# Altium footprint library PCB_Module.PcbLib: 32 footprints (part 1 of 2)
Each footprint in its own frame and in the unit in brackets; x right, y up, seen from the top. Pads: shape width x height; smd on the part's side, far side on the other; paste and mask are expansions set on the pad; w line width, h text height; cw(c..) or ccw(c..) is an arc to the next point about the centre after c.
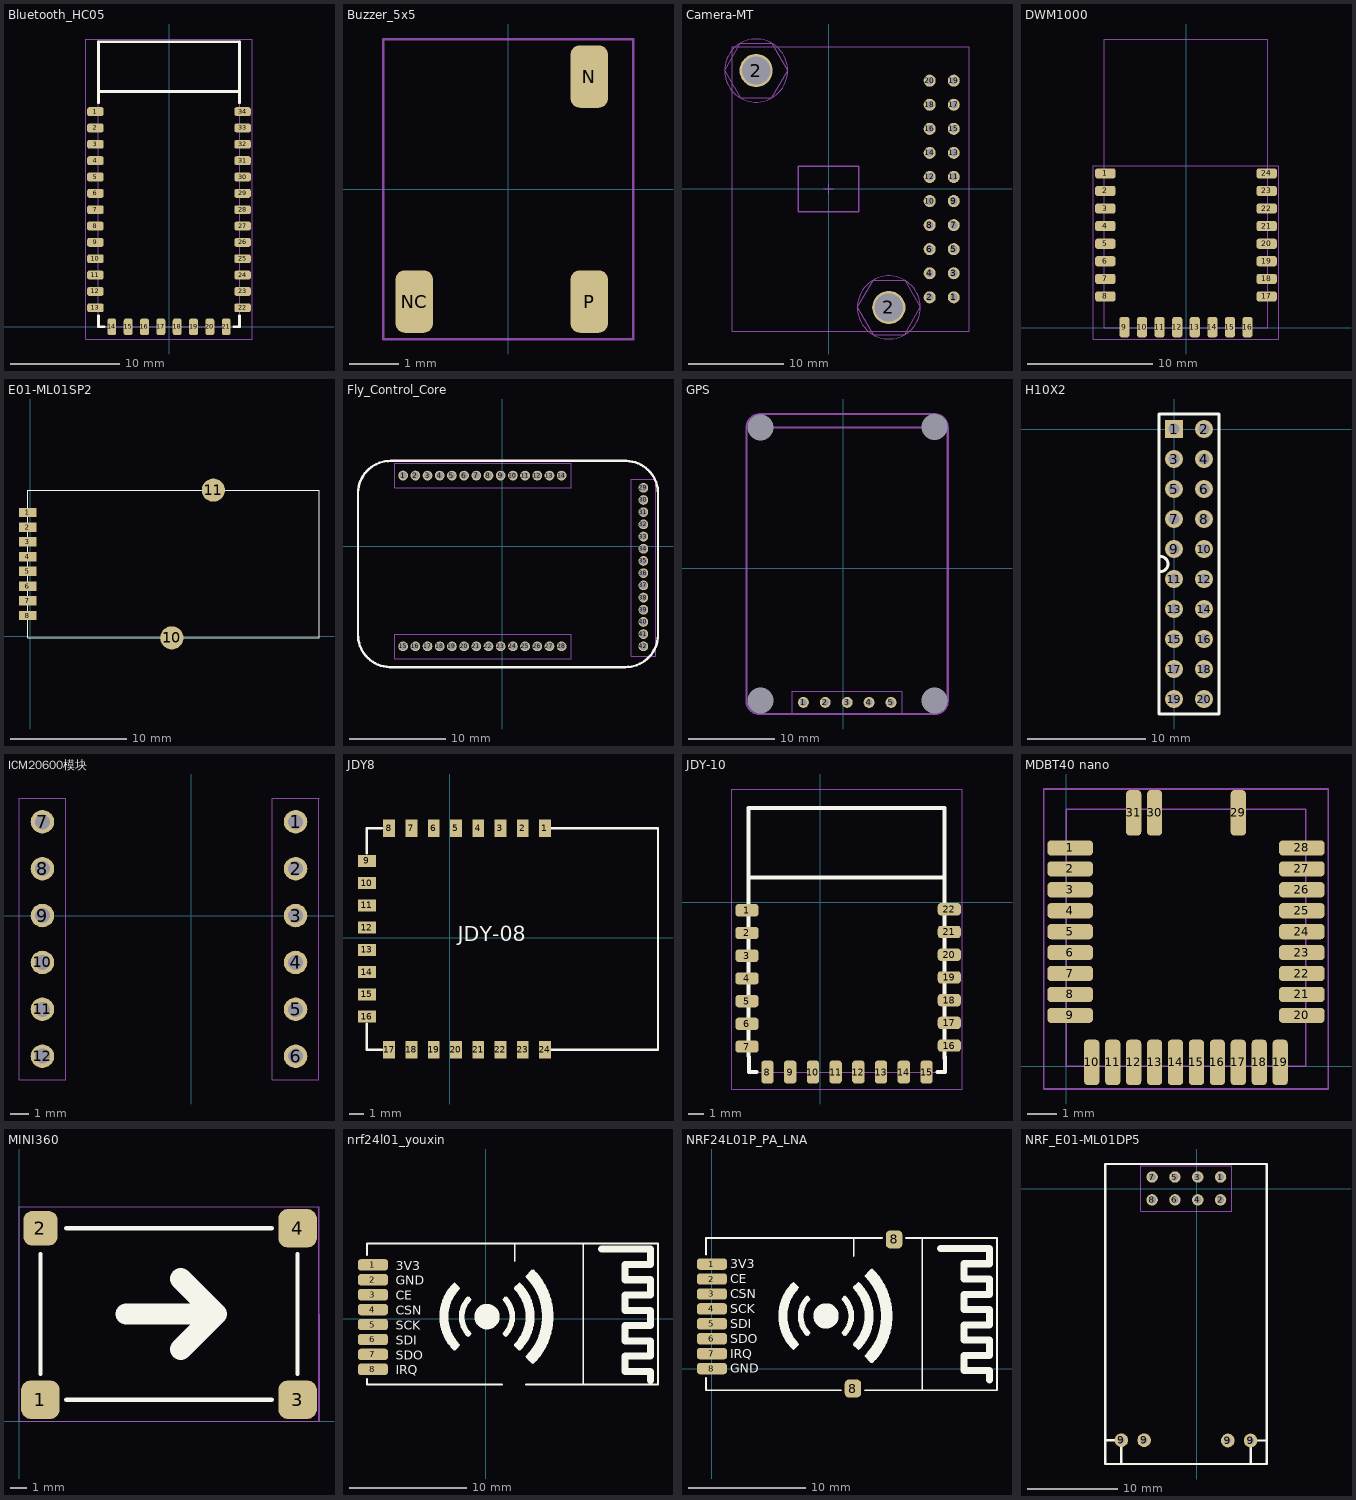
[diagram p0: the footprints below, top view; thin cyan lines are the x and y axes]

## Bluetooth_HC05 [mil]
pads (34):
  rrect50% 60x32 smd: 1(-265.91,777.56) 2(-265.91,718.5) 3(-265.91,659.45) 4(-265.91,600.39) 5(-265.91,541.34) 6(-265.91,482.28) 7(-265.91,423.23) 8(-265.91,364.17) 9(-265.91,305.12) 10(-265.91,246.06) 11(-265.91,187.01) 12(-265.91,127.95) 13(-265.91,68.9) 22(265.91,68.9) 23(265.91,127.95) 24(265.91,187.01) 25(265.91,246.06) 26(265.91,305.12) 27(265.91,364.17) 28(265.91,423.23) 29(265.91,482.28) 30(265.91,541.34) 31(265.91,600.39) 32(265.91,659.45) 33(265.91,718.5) 34(265.91,777.56)
  rrect50% 32x60 smd: 14(-206.69,0) 15(-147.64,0) 16(-88.58,0) 17(-29.53,0) 18(29.53,0) 19(88.58,0) 20(147.64,0) 21(206.69,0)
Top Overlay:
  lines w10: -255,40 -255,0 -235,0 ; -255,810 -255,850 ; 235,0 255,0 255,40 ; 255,810 255,850 ; -255,850 255,850 ; -255,850 -255,1030 255,1030 255,850
Mechanical 13:
  lines w2: -255.91,850.39 255.91,850.39 ; -255.91,0 -255.91,1039.37 255.91,1039.37 255.91,0 -255.91,0
T-Component:
  lines w2: -300,-44 -300,1040 300,1040 300,-44 -300,-44
3D body "User Library-Bluetooth HC-06_.STEP": height 92.52, standoff 0, extent -275.98,0 275.98,1102.76

## Buzzer_5x5 [mil]
pads (3):
  rrect50% 30x50 smd: N(65,90) NC(-75,-90) P(65,-90)
T-Component:
  lines w2: -100,-120 100,-120 100,120 -100,120 -100,-120
3D body "css-0575b-smt.stp": height 106.3, standoff 0, extent -98.44,-98.43 98.41,98.43

## Camera-MT [mil]
pads (22):
  round 50 hole 31: 1(520,-450) 2(420,-450) 3(520,-350) 4(420,-350) 5(520,-250) 6(420,-250) 7(520,-150) 8(420,-150) 9(520,-50) 10(420,-50) 11(520,50) 12(420,50) 13(520,150) 14(420,150) 15(520,250) 16(420,250) 17(520,350) 18(420,350) 19(520,450) 20(420,450)
  round 137.8 hole 118.11 mask+0: 2(-300.94,492.13) 2(250.24,-492.13)
Mechanical 13:
  circle w2: c250.24,-492.13 r130.98
  circle w2: c-300.94,492.13 r130.98
  lines w2: -19.69,0 19.68,0 ; 0,-19.69 0,19.68 ; -431.92,492.13 -366.43,378.7 -235.46,378.7 -169.97,492.12 -235.46,605.55 -366.43,605.55 -431.92,492.13 ; -399.37,-590.55 584.88,-590.55 584.88,590.55 -399.37,590.55 -399.37,-590.55 ; 119.26,-492.13 184.75,-605.56 315.72,-605.56 381.21,-492.13 315.72,-378.7 184.75,-378.7 119.26,-492.13
  lines w6: -126,-94 -126,94 126,94 126,-94 -126,-94
B-Component:
  lines w1: 510,-450 530,-450 ; 510,-350 530,-350 ; 510,-250 530,-250 ; 510,-150 530,-150 ; 510,-50 530,-50 ; 510,50 530,50 ; 510,150 530,150 ; 510,250 530,250 ; 510,350 530,350 ; 510,450 530,450 ; 520,-460 520,-440 ; 520,-360 520,-340 ; 520,-260 520,-240 ; 520,-160 520,-140 ; 520,-60 520,-40 ; 520,40 520,60 ; 520,140 520,160 ; 520,240 520,260 ; 520,340 520,360 ; 520,440 520,460
3D body "female_header_a-bl254-dg-g04d.stp": height 334.65, standoff -125.98, extent 371.57,-504.91 568.42,-295.07
3D body "female_header_a-bl254-dg-g06d.stp": height 334.65, standoff -125.98, extent 371.57,-304.92 568.42,4.93
3D body "female_header_a-bl254-dg-g06d.stp": height 334.65, standoff -125.98, extent 371.57,195.08 568.42,504.93
3D body "female_header_a-bl254-dg-g04d.stp": height 334.65, standoff -125.98, extent 371.57,-4.91 568.42,204.93
3D body "Camera-MT__Pcb.step": height 528.82, standoff 114.65, extent -399.36,-590.55 584.89,590.55

## DWM1000 [mil]
pads (24):
  rrect50% 64x32 smd: 1(-253,484.25) 2(-253,429.13) 3(-253,374.02) 4(-253,318.9) 5(-253,263.78) 6(-253,208.66) 7(-253,153.54) 8(-253,98.43) 17(253,98.43) 18(253,153.54) 19(253,208.66) 20(253,263.78) 21(253,318.9) 22(253,374.02) 23(253,429.13) 24(253,484.25)
  rrect50% 32x64 smd: 9(-192.91,2) 10(-137.8,2) 11(-82.68,2) 12(-27.56,2) 13(27.56,2) 14(82.68,2) 15(137.8,2) 16(192.91,2)
Mechanical 13:
  lines w1.97: -255.91,905.51 -255.91,0 255.91,0 255.91,905.51
  lines w2: -255.91,905.51 255.91,905.51
T-Component:
  lines w2: -290,-35 290,-35 290,508 -290,508 -290,-35
3D body "DWM1000 Module.STEP": height 114.17, standoff -0.39, extent -255.9,0 255.9,905.51

## E01-ML01SP2 [mm]
pads (10):
  rect 1.5x0.8 smd: 1(-0.225,10.689) 2(-0.225,9.419) 3(-0.225,8.149) 4(-0.225,6.879) 5(-0.225,5.609) 6(-0.225,4.339) 7(-0.225,3.069) 8(-0.225,1.799)
  round 2 smd: 10(12.195,-0.121) 11(15.775,12.609)
Top Overlay:
  lines w0.1: -0.225,-0.121 24.875,-0.121 24.875,12.609 -0.225,12.609 -0.225,-0.121

## Fly_Control_Core [mil]
height 50
pads (42):
  round 40 hole 30: 1(-406.44,288.88) 2(-356.44,288.88) 3(-306.44,288.88) 4(-256.44,288.88) 5(-206.44,288.88) 6(-156.44,288.88) 7(-106.44,288.88) 8(-56.44,288.88) 9(-6.44,288.88) 10(43.56,288.88) 11(93.56,288.88) 12(143.56,288.88) 13(193.56,288.88) 14(243.56,288.88) 15(-406.44,-411.11) 16(-356.44,-411.11) 17(-306.44,-411.11) 18(-256.44,-411.11) 19(-206.44,-411.12) 20(-156.44,-411.12) 21(-106.44,-411.12) 22(-56.44,-411.12) 23(-6.44,-411.12) 24(43.56,-411.12) 25(93.56,-411.12) 26(143.56,-411.12) 27(193.56,-411.12) 28(243.56,-411.12) 29(578.56,238.88) 30(578.56,188.88) 31(578.56,138.88) 32(578.56,88.88) 33(578.56,38.88) 34(578.56,-11.12) 35(578.55,-61.12) 36(578.55,-111.12) 37(578.55,-161.12) 38(578.55,-211.12) 39(578.55,-261.12) 40(578.55,-311.12) 41(578.55,-361.12) 42(578.55,-411.12)
Top Overlay:
  lines w10: 638.56,-366.12 cw(c506.06,-363.62) 503.56,-496.12 -461.44,-496.12 cw(c-458.94,-363.62) -591.44,-361.12 -591.44,218.88 cw(c-458.94,216.38) -456.44,348.88 478.56,348.88 508.56,348.88 cw(c506.06,216.38) 638.56,213.88 638.56,-361.12
Mechanical 13:
  lines w2: -441.44,-461.11 -441.44,-361.11 283.56,-361.11 283.56,-461.11 -441.44,-461.11 ; -441.44,238.88 -441.44,338.88 283.56,338.88 283.56,238.88 -441.44,238.88 ; 528.56,-451.12 528.56,273.88 628.56,273.88 628.56,-451.12 528.56,-451.12
T-Component:
  lines w2: -441.44,-461.11 283.56,-461.11 283.56,-361.11 -441.44,-361.11 -441.44,-461.11 ; -441.44,238.88 283.56,238.88 283.56,338.88 -441.44,338.88 -441.44,238.88 ; 528.56,-451.12 628.56,-451.12 628.56,273.88 528.56,273.88 528.56,-451.12
3D body "飞控PCB.step": height 184.37, standoff 52.3, extent -597.54,-502.32 642.46,352.68
3D body "pin_header_a-sl127-eg-g14d.stp": height 197.36, standoff -115.24, extent -430.41,-461.58 269.59,-363.16
3D body "pin_header_a-sl127-eg-g14d.stp": height 197.36, standoff -115.24, extent 528.26,-438.05 626.69,261.95
3D body "pin_header_a-sl127-eg-g14d.stp": height 197.36, standoff -115.24, extent -429.36,240.89 270.64,339.32

## GPS [mil]
pads (9):
  round 30 hole 118.11: 0(-376.93,-604.32) 0(-376.93,641.71) 0(417.35,-604.32) 0(417.35,643.71)
  round 50 hole 32: 1(-180.99,-612.59) 2(-80.99,-612.59) 3(19.01,-612.59) 4(119.01,-612.59) 5(219.01,-612.59)
Mechanical 13:
  lines w2: -230.99,-662.59 -230.99,-562.59 269.01,-562.59 269.01,-662.59 -230.99,-662.59
  lines w10: -376.93,641.71 415.35,641.71 ; -440.66,-610.91 ccw(c-379.8,-604.39) -373.28,-665.24 419.3,-665.24 ccw(c418.94,-606.92) 477.26,-606.56 477.26,642.44 ccw(c416.4,641.71) 415.68,702.57 -375.45,702.57 ccw(c-376.9,638.82) -440.66,640.27 -440.66,-610.91
T-Component:
  lines w2: -230.99,-662.59 269.01,-662.59 269.01,-562.59 -230.99,-562.59 -230.99,-662.59
3D body "pin_header_aw140-eg-g05d.stp": height 118.11, standoff -322.83, extent -230.99,-662.05 269.01,-563.68

## H10X2 [mil] "鹰眼直插管脚"
pads (20):
  rect 60x60 hole 36: 1(0,0)
  round 60 hole 36: 2(100,0) 3(0,-100) 4(100,-100) 5(0,-200) 6(100,-200) 7(0,-300) 8(100,-300) 9(0,-400) 10(100,-400) 11(0,-500) 12(100,-500) 13(0,-600) 14(100,-600) 15(0,-700) 16(100,-700) 17(0,-800) 18(100,-800) 19(0,-900) 20(100,-900)
Top Overlay:
  lines w10: -45.14,-475 ccw(c-45.14,-450) -45,-425 ; 25,50 150,50 150,-950 -50,-950 -50,50 75,50
3D body "female_header_a-bl254-dg-g20d.stp": height 334.65, standoff -125.98, extent -44.7,-956.6 152.15,53.25
3D body "Camera-MT__Pcb.step": height 528.82, standoff 114.65, extent -49.21,-1053.22 935.05,127.88

## ICM20600模块 [mil]
pads (12):
  round 50 hole 32: 1(222.79,200.85) 2(222.79,100.85) 3(222.79,0.85) 4(222.79,-99.15) 5(222.79,-199.15) 6(222.79,-299.15) 7(-317.21,200.85) 8(-317.21,100.85) 9(-317.21,0.85) 10(-317.21,-99.15) 11(-317.21,-199.15) 12(-317.21,-299.15)
Mechanical 13:
  lines w2: -367.21,-349.15 -367.21,250.85 -267.21,250.85 -267.21,-349.15 -367.21,-349.15 ; 172.79,-349.15 172.79,250.85 272.79,250.85 272.79,-349.15 172.79,-349.15
T-Component:
  lines w2: -367.21,-349.15 -367.21,250.85 -267.21,250.85 -267.21,-349.15 -367.21,-349.15 ; 172.79,-349.15 172.79,250.85 272.79,250.85 272.79,-349.15 172.79,-349.15
3D body "pin_header_aw140-eg-g06d.stp": height 322.83, standoff -118.11, extent -366.4,-349.15 -268.03,250.85
3D body "pin_header_aw140-eg-g06d.stp": height 322.83, standoff -118.11, extent 173.6,-349.15 271.97,250.85

## JDY8 [mm]
pads (24):
  rect 0.8x1.2 smd: 1(6.405,7.367) 2(4.905,7.367) 3(3.405,7.367) 4(1.905,7.367) 5(0.405,7.367) 6(-1.095,7.367) 7(-2.595,7.367) 8(-4.095,7.367) 17(-4.095,-7.568) 18(-2.595,-7.568) 19(-1.095,-7.568) 20(0.405,-7.568) 21(1.905,-7.568) 22(3.405,-7.568) 23(4.905,-7.568) 24(6.405,-7.568)
  rect 1.2x0.8 smd: 9(-5.595,5.165) 10(-5.595,3.665) 11(-5.595,2.165) 12(-5.595,0.665) 13(-5.595,-0.835) 14(-5.595,-2.335) 15(-5.595,-3.835) 16(-5.595,-5.335)
Top Overlay:
  lines w0.16: -5.595,-5.809 -5.595,-7.568 -4.579,-7.568 ; -5.595,5.666 -5.595,7.367 -4.579,7.367 ; 6.87,-7.568 7.593,-7.568 14.02,-7.568 14.02,5.462 14.02,7.367 8.965,7.367 6.87,7.367
  text "JDY-08" at 0.536,-0.237 h1

## JDY-10 [mil]
pads (22):
  rrect50% 60x32 smd: 1(-190.06,-20.47) 2(-190.06,-79.52) 3(-190.06,-138.58) 4(-190.06,-197.63) 5(-190.06,-256.69) 6(-190.06,-315.74) 7(-190.06,-374.8) 16(335.82,-372.16) 17(335.82,-313.1) 18(335.82,-254.05) 19(335.82,-194.99) 20(335.82,-135.94) 21(335.82,-76.88) 22(335.82,-17.83)
  rrect50% 32x60 smd: 8(-136.78,-441.05) 9(-77.72,-441.05) 10(-18.67,-441.05) 11(40.39,-441.05) 12(99.44,-441.05) 13(158.5,-441.05) 14(217.55,-441.05) 15(276.61,-441.05)
Top Overlay:
  lines w10: -186.37,-399.15 -186.37,64.98 ; -185.09,-401.05 -185.08,-441.05 -165.09,-441.05 ; 304.92,-441.05 324.92,-441.05 324.92,-401.05 ; 323.63,-406.15 323.63,64.98 ; -186.37,64.98 323.63,64.98 ; -186.37,64.98 -186.37,244.98 323.63,244.98 323.63,64.98
Mechanical 13:
  lines w2: -187.27,65.37 324.54,65.37 ; -185.99,-441.05 325.82,-441.05
T-Component:
  lines w2: -230.08,-485.05 -230.08,294.82 369.92,294.82 369.92,-485.05 -230.08,-485.05

## MDBT40 nano [mil]
pads (31):
  rrect50% 60x20 smd: 1(5,287.4) 2(5,259.84) 3(5,232.28) 4(5,204.72) 5(5,177.17) 6(5,149.61) 7(5,122.05) 8(5,94.49) 9(5,66.93) 20(310,66.93) 21(310,94.49) 22(310,122.05) 23(310,149.61) 24(310,177.17) 25(310,204.72) 26(310,232.28) 27(310,259.84) 28(310,287.4)
  rrect50% 20x60 smd: 10(33.46,5) 11(61.02,5) 12(88.58,5) 13(116.14,5) 14(143.7,5) 15(171.26,5) 16(198.82,5) 17(226.38,5) 18(253.94,5) 19(281.5,5) 29(226.38,333.58) 30(116.14,333.58) 31(88.58,333.58)
Mechanical 13:
  lines w2: 0,0 0,338.58 314.96,338.58 314.96,0 0,0
T-Component:
  lines w2: -30,-30 345,-30 345,365 -30,365 -30,-30

## MINI360 [mil]
pads (4):
  rrect50% 90x90 smd: 1(50,50) 3(650,50) 4(650,450)
  rrect50% 80x80 smd: 2(50,450)
Top Overlay:
  lines w10: 50,110 50,390 ; 110,50 590,50 ; 110,450 590,450 ; 650,110 650,390
  lines w50: 250,250 460,250 ; 377.5,167.5 460,250 ; 377.5,332.5 460,250
Mechanical 13:
  lines w2: 0,0 0,500 700,500 700,0 0,0
T-Component:
  lines w2: 0,0 0,500 700,500 700,0 0,0

## nrf24l01_youxin [mil]
pads (8):
  rrect50% 100x38 smd: 1(-377.57,180.39) 2(-377.57,130.39) 3(-377.57,80.39) 4(-377.57,30.39) 5(-377.57,-19.61) 6(-377.57,-69.61) 7(-377.57,-119.61) 8(-377.57,-169.61)
Top Overlay:
  circle w45: c4.43,6.8 r20
  lines w6: -397.57,-201.1 -397.57,-220.68 55.5,-220.68 ; -397.57,212.28 -397.57,251.97 272.12,251.97 ; 97.27,192.05 97.27,252.05 ; 134.24,-220.68 577.43,-220.68 ; 272.03,251.97 577.43,251.97 ; 327.35,-218.72 327.35,251.58 ; 577.43,-218.72 577.43,251.09
  lines w10: -111.07,-95.7 -104.57,-102.2 -90.57,-88.2 -95.57,-83.2 ; -110.57,109.8 -104.57,115.8 -90.57,101.8 -95.57,96.8 ; -63.57,-51.2 -58.57,-56.2 -52.57,-50.2 -57.57,-45.2 ; -63.57,64.8 -58.57,69.8 -52.57,63.8 -57.57,58.8 ; 66.43,-45.2 61.43,-50.2 67.43,-56.2 72.43,-51.2 ; 66.43,58.8 61.43,63.8 67.43,69.8 72.43,64.8 ; 104.43,-83.2 99.43,-88.2 113.43,-102.2 119.43,-96.2 ; 104.43,96.8 99.43,101.8 113.43,115.8 119.93,109.3 ; 147.93,-117.7 138.43,-127.2 157.93,-146.7 167.43,-137.2 ; 148.43,130.8 138.43,140.8 157.93,160.3 166.93,151.3
  lines w19: -58.99,-49.58 cw(c4.43,6.8) -58.94,63.23 ; 67.79,-49.64 ccw(c4.43,6.8) 67.85,63.17
  lines w23.62: 387.43,232.8 551.84,232.8 551.84,181.62 467.43,181.62 467.43,130.43 551.84,130.43 551.84,79.25 467.43,79.25 467.43,28.07 551.84,28.07 551.84,-23.11 467.43,-23.11 467.43,-74.29 551.84,-74.29 551.84,-125.47 467.43,-125.47 467.43,-176.65 551.84,-176.65 551.84,-207.2
  lines w30: -104.81,-87.41 cw(c4.43,6.8) -104.81,101 ; 113.67,-87.41 ccw(c4.43,6.8) 113.67,101
  lines w38: 157.99,-126.95 ccw(c4.43,6.8) 157.99,140.55
  text "CE" at -301.04,63.22 h30
  text "3V3" at -301.04,162.81 h30
  text "CSN" at -301.04,13.22 h30
  text "SCK" at -301.04,-36.78 h30
  text "SDI" at -301.04,-86.78 h30
  text "SDO" at -301.04,-136.78 h30
  text "IRQ" at -301.04,-186.78 h30
  text "GND" at -301.04,113.3 h30
3D body "RF.step": height 46.5, standoff -0.8, extent -383.05,-235.05 581.95,264.95

## NRF24L01P_PA_LNA [mil]
pads (10):
  rrect50% 100x38 smd: 1(0,350) 2(0,300) 3(0,250) 4(0,200) 5(0,150) 6(0,100) 7(0,50) 8(0,0)
  rrect50% 55x60 smd: 8(472.44,-66.93) 8(610.24,432.68)
Top Overlay:
  circle w45: c382,176.4 r20
  lines w6: -20,-31.5 -20,-72.6 433.07,-72.6 ; -20,381.89 -20,437.4 570.87,437.4 ; 474.84,377.4 474.84,437.4 ; 511.81,-72.6 955,-72.6 955,437.4 649.61,437.4 ; 704.92,-72.6 704.92,437.4
  lines w10: 266.5,73.9 273,67.4 287,81.4 282,86.4 ; 267,279.4 273,285.4 287,271.4 282,266.4 ; 314,118.4 319,113.4 325,119.4 320,124.4 ; 314,234.4 319,239.4 325,233.4 320,228.4 ; 444,124.4 439,119.4 445,113.4 450,118.4 ; 444,228.4 439,233.4 445,239.4 450,234.4 ; 482,86.4 477,81.4 491,67.4 497,73.4 ; 482,266.4 477,271.4 491,285.4 497.5,278.9 ; 525.5,51.9 516,42.4 535.5,22.9 545,32.4 ; 526,300.4 516,310.4 535.5,329.9 544.5,320.9
  lines w19: 318.58,120.03 cw(c382,176.4) 318.63,232.84 ; 445.37,119.97 ccw(c382,176.4) 445.42,232.77
  lines w23.62: 765,402.4 929.41,402.4 929.41,351.22 845,351.22 845,300.04 929.41,300.04 929.41,248.86 845,248.86 845,197.68 929.41,197.68 929.41,146.5 845,146.5 845,95.31 929.41,95.31 929.41,44.13 845,44.13 845,-7.05 929.41,-7.05 929.41,-37.6
  lines w30: 272.76,82.2 cw(c382,176.4) 272.76,270.61 ; 491.24,82.2 ccw(c382,176.4) 491.24,270.61
  lines w38: 535.57,42.65 ccw(c382,176.4) 535.57,310.15
  text "GND" at 61,-14.6 h30
  text "IRQ" at 61,35.4 h30
  text "SDO" at 61,85.4 h30
  text "SDI" at 61,135.4 h30
  text "SCK" at 61,185.4 h30
  text "CSN" at 61,235.4 h30
  text "3V3" at 61,335.4 h30
  text "CE" at 61,285.4 h30
3D body "RF.step": height 46.5, standoff -0.8, extent -15,-67.6 950,432.4

## NRF_E01-ML01DP5 [mil]
pads (12):
  round 50 hole 32: 1(105.28,52.07) 2(105.28,-47.93) 3(5.28,52.07) 4(5.28,-47.93) 5(-94.72,52.07) 6(-94.72,-47.93) 7(-194.72,52.07) 8(-194.72,-47.93)
  round 60 hole 30: 9(-329.88,-1101.58) 9(-229.88,-1101.58) 9(136.97,-1102.96) 9(236.97,-1102.96)
Top Overlay:
  lines w10: -397.99,-1101.58 -329.88,-1101.58 -329.88,-1203.94 ; 236.97,-1205.32 236.97,-1102.96 305.08,-1102.96 ; 307.48,-1205.81 -400.63,-1205.81 -400.63,109.15 308.03,109.15 308.03,52.07 308.03,-1205.81
Mechanical 13:
  lines w2: -244.72,-97.93 155.28,-97.93 155.28,102.07 -244.72,102.07 -244.72,-97.93
T-Component:
  lines w2: -244.72,-97.93 155.28,-97.93 155.28,102.07 -244.72,102.07 -244.72,-97.93
3D body "pin_header_awl254-dg-g08d.stp": height 118.11, standoff -334.65, extent -244.72,-97.93 155.28,102.07